# Altium footprint library pcb.PcbLib: 397 footprints (part 13 of 25)
Each footprint in its own frame and in the unit in brackets; x right, y up, seen from the top. Pads: shape width x height; smd on the part's side, far side on the other; paste and mask are expansions set on the pad; w line width, h text height; cw(c..) or ccw(c..) is an arc to the next point about the centre after c.
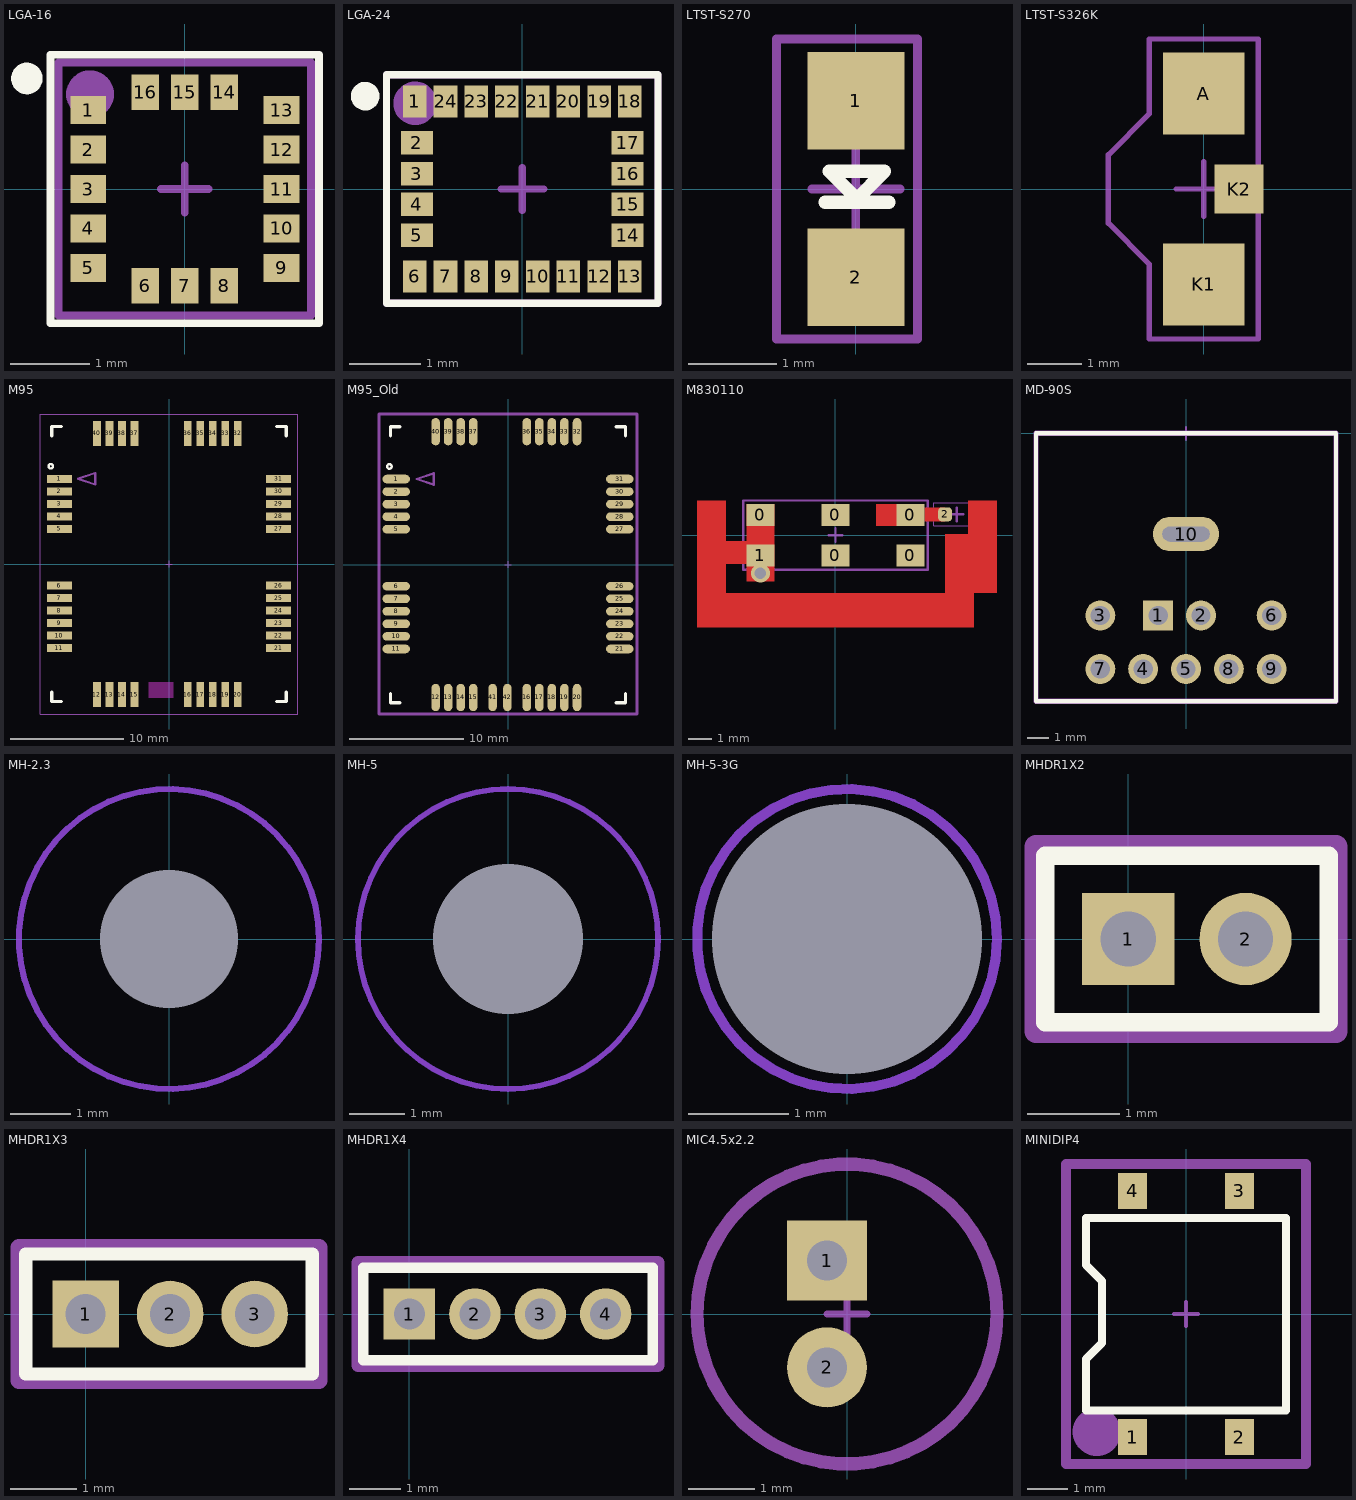
[diagram p12: the footprints below, top view; thin cyan lines are the x and y axes]

## LGA-16 [mm]
height 1
pads (16):
  rect 0.45x0.35 smd paste-0.05 mask+0.05: 1(-1.225,1) 2(-1.225,0.5) 3(-1.225,0) 4(-1.225,-0.5) 5(-1.225,-1) 9(1.225,-1) 10(1.225,-0.5) 11(1.225,0) 12(1.225,0.5) 13(1.225,1)
  rect 0.35x0.45 smd paste-0.05 mask+0.05: 6(-0.5,-1.225) 7(0,-1.225) 8(0.5,-1.225) 14(0.5,1.225) 15(0,1.225) 16(-0.5,1.225)
Top Overlay:
  circle w0.2: c-2,1.4 r0.1
  lines w0.1: -1.7,-1.7 1.7,-1.7 1.7,1.7 -1.7,1.7 -1.7,-1.7
Mechanical 15:
  circle w0.406: c-1.2,1.2 r0.1
  lines w0.1: -0.3,0 0.3,0 ; 0,-0.3 0,0.3 ; -1.6,-1.6 -1.6,1.6 1.6,1.6 1.6,-1.6 -1.6,-1.6
  text ".Designator" at -1.3,-1.3 h1.02
3D body: height 1, standoff 0, extent -1.5,-1.5 1.5,1.5

## LGA-24 [mm]
height 1
pads (24):
  rect 0.33x0.45 smd paste-0.05 mask+0.05: 1(-1.505,1.225) 6(-1.505,-1.225) 7(-1.075,-1.225) 8(-0.645,-1.225) 9(-0.215,-1.225) 10(0.215,-1.225) 11(0.645,-1.225) 12(1.075,-1.225) 13(1.505,-1.225) 18(1.505,1.225) 19(1.075,1.225) 20(0.645,1.225) 21(0.215,1.225) 22(-0.215,1.225) 23(-0.645,1.225) 24(-1.075,1.225)
  rect 0.45x0.33 smd paste-0.05 mask+0.05: 2(-1.475,0.645) 3(-1.475,0.215) 4(-1.475,-0.215) 5(-1.475,-0.645) 14(1.475,-0.645) 15(1.475,-0.215) 16(1.475,0.215) 17(1.475,0.645)
Top Overlay:
  circle w0.2: c-2.2,1.3 r0.1
  lines w0.1: -1.9,-1.6 -1.9,1.6 1.9,1.6 1.9,-1.6 -1.9,-1.6
Mechanical 15:
  circle w0.406: c-1.5,1.2 r0.1
  lines w0.1: -0.3,0 0.3,0 ; 0,-0.3 0,0.3 ; -1.9,-1.6 1.9,-1.6 1.9,1.6 -1.9,1.6 -1.9,-1.6
  text ".Designator" at -1.6,-1.3 h1.02
3D body: height 1, standoff 0, extent -1.75,-1.5 1.75,1.5

## LTST-S270 [mm] "Chip LED, Right Angle"
height 1
pads (2):
  rect 1.1x1.1 smd: 1(0,1) 2(0,-1)
Top Overlay:
  lines w0.15: -0.35,-0.15 0.375,-0.15 ; -0.3,0.2 0,-0.1 0,-0.125 0.325,0.2 -0.3,0.2
Mechanical 15:
  lines w0.1: -0.5,0 0.5,0 ; 0,-0.5 0,0.5 ; -0.9,-1.7 0.7,-1.7 0.7,1.7 -0.9,1.7 -0.9,-1.7
  text "K" at 0.9,-1.5 h1.02
  text "A" at 0.928,0.568 h1.02
  text ".Designator" at 0.3,-1.5 h0.51
3D body: height 1, standoff 0, extent -0.81,-0.6 -0.34,0.6
3D body: height 1, standoff 0, extent -0.34,-0.825 0.34,0.825

## LTST-S326K [mm] "Chip LED, Right Angle"
height 1
pads (3):
  rect 1.5x1.5 smd: A(0,1.75) K1(0,-1.75)
  rect 0.9x0.9 smd: K2(0.65,0)
Mechanical 15:
  lines w0.1: -0.5,0 0.5,0 ; 0,-0.5 0,0.5 ; -1.75,-0.625 -1.75,0.625 -1,1.375 -1,2.75 1,2.75 1,-2.75 -1,-2.75 -1,-1.375 -1.75,-0.625
  text ".Designator" at -1.25,-0.75 h0.51
3D body: height 1, standoff 0, extent -0.5,-1.5 0.5,1.5
3D body: height 0.9, standoff 0.1, extent -1.5,-1 -0.5,1

## M95 [mm]
height 0.8
pads (40):
  rect 2.2x0.7 smd paste-10 mask+0.05: 1(-9.65,7.5) 2(-9.65,6.4) 3(-9.65,5.3) 4(-9.65,4.2) 5(-9.65,3.1) 6(-9.65,-1.9) 7(-9.65,-3) 8(-9.65,-4.1) 9(-9.65,-5.2) 10(-9.65,-6.3) 11(-9.65,-7.4) 21(9.65,-7.4) 22(9.65,-6.3) 23(9.65,-5.2) 24(9.65,-4.1) 25(9.65,-3) 26(9.65,-1.9) 27(9.65,3.1) 28(9.65,4.2) 29(9.65,5.3) 30(9.65,6.4) 31(9.65,7.5)
  rect 0.7x2.2 smd paste-10 mask+0.05: 12(-6.35,-11.5) 13(-5.25,-11.5) 14(-4.15,-11.5) 15(-3.05,-11.5) 16(1.65,-11.5) 17(2.75,-11.5) 18(3.85,-11.5) 19(4.95,-11.5) 20(6.05,-11.5) 32(6.05,11.5) 33(4.95,11.5) 34(3.85,11.5) 35(2.75,11.5) 36(1.65,11.5) 37(-3.05,11.5) 38(-4.15,11.5) 39(-5.25,11.5) 40(-6.35,11.5)
Top Layer keep-out:
  rectangle: -1.8,-11.8 0.4,-10.4
Top Overlay:
  circle w0.2: c-10.4,8.6 r0.2
  lines w0.3: -10.3,-11.3 -10.3,-12.1 -9.5,-12.1 ; -10.3,11.3 -10.3,12.1 -9.5,12.1 ; 9.5,-12.1 10.3,-12.1 10.3,-11.3 ; 9.5,12.1 10.3,12.1 10.3,11.3
Top Paste:
  region: 5.7,-11.8 5.7,-12.9 6.4,-12.9 6.4,-11.8
  region: 5.8,-10.6 5.8,-11.8 6.3,-11.8 6.3,-10.6
  region: 4.6,-11.8 4.6,-12.9 5.3,-12.9 5.3,-11.8
  region: 4.7,-10.6 4.7,-11.8 5.2,-11.8 5.2,-10.6
  region: 3.5,-11.8 3.5,-12.9 4.2,-12.9 4.2,-11.8
  region: 3.6,-10.6 3.6,-11.8 4.1,-11.8 4.1,-10.6
  region: 2.4,-11.8 2.4,-12.9 3.1,-12.9 3.1,-11.8
  region: 2.5,-10.6 2.5,-11.8 3,-11.8 3,-10.6
  region: 1.3,-11.8 1.3,-12.9 2,-12.9 2,-11.8
  region: 1.4,-10.6 1.4,-11.8 1.9,-11.8 1.9,-10.6
  region: -3.4,-11.8 -3.4,-12.9 -2.7,-12.9 -2.7,-11.8
  region: -3.3,-10.6 -3.3,-11.8 -2.8,-11.8 -2.8,-10.6
  region: -4.5,-11.8 -4.5,-12.9 -3.8,-12.9 -3.8,-11.8
  region: -4.4,-10.6 -4.4,-11.8 -3.9,-11.8 -3.9,-10.6
  region: -5.6,-11.8 -5.6,-12.9 -4.9,-12.9 -4.9,-11.8
  region: -5.5,-10.6 -5.5,-11.8 -5,-11.8 -5,-10.6
  region: -6.7,-11.8 -6.7,-12.9 -6,-12.9 -6,-11.8
  region: -6.6,-10.6 -6.6,-11.8 -6.1,-11.8 -6.1,-10.6
  region: 6.4,11.8 6.4,12.9 5.7,12.9 5.7,11.8
  region: 6.3,10.6 6.3,11.8 5.8,11.8 5.8,10.6
  region: 5.3,11.8 5.3,12.9 4.6,12.9 4.6,11.8
  region: 5.2,10.6 5.2,11.8 4.7,11.8 4.7,10.6
  region: 4.2,11.8 4.2,12.9 3.5,12.9 3.5,11.8
  region: 4.1,10.6 4.1,11.8 3.6,11.8 3.6,10.6
  region: 3.1,11.8 3.1,12.9 2.4,12.9 2.4,11.8
  region: 3,10.6 3,11.8 2.5,11.8 2.5,10.6
  region: 2,11.8 2,12.9 1.3,12.9 1.3,11.8
  region: 1.9,10.6 1.9,11.8 1.4,11.8 1.4,10.6
  region: -2.7,11.8 -2.7,12.9 -3.4,12.9 -3.4,11.8
  region: -2.8,10.6 -2.8,11.8 -3.3,11.8 -3.3,10.6
  region: -3.8,11.8 -3.8,12.9 -4.5,12.9 -4.5,11.8
  region: -3.9,10.6 -3.9,11.8 -4.4,11.8 -4.4,10.6
  region: -4.9,11.8 -4.9,12.9 -5.6,12.9 -5.6,11.8
  region: -5,10.6 -5,11.8 -5.5,11.8 -5.5,10.6
  region: -6,11.8 -6,12.9 -6.7,12.9 -6.7,11.8
  region: -6.1,10.6 -6.1,11.8 -6.6,11.8 -6.6,10.6
  region: -9.95,7.85 -11.05,7.85 -11.05,7.15 -9.95,7.15
  region: -8.75,7.75 -9.95,7.75 -9.95,7.25 -8.75,7.25
  region: -9.95,6.75 -11.05,6.75 -11.05,6.05 -9.95,6.05
  region: -8.75,6.65 -9.95,6.65 -9.95,6.15 -8.75,6.15
  region: -9.95,5.65 -11.05,5.65 -11.05,4.95 -9.95,4.95
  region: -8.75,5.55 -9.95,5.55 -9.95,5.05 -8.75,5.05
  region: -9.95,4.55 -11.05,4.55 -11.05,3.85 -9.95,3.85
  region: -8.75,4.45 -9.95,4.45 -9.95,3.95 -8.75,3.95
  region: -9.95,3.45 -11.05,3.45 -11.05,2.75 -9.95,2.75
  region: -8.75,3.35 -9.95,3.35 -9.95,2.85 -8.75,2.85
  region: -9.95,-1.55 -11.05,-1.55 -11.05,-2.25 -9.95,-2.25
  region: -8.75,-1.65 -9.95,-1.65 -9.95,-2.15 -8.75,-2.15
  region: -9.95,-2.65 -11.05,-2.65 -11.05,-3.35 -9.95,-3.35
  region: -8.75,-2.75 -9.95,-2.75 -9.95,-3.25 -8.75,-3.25
  region: -9.95,-3.75 -11.05,-3.75 -11.05,-4.45 -9.95,-4.45
  region: -8.75,-3.85 -9.95,-3.85 -9.95,-4.35 -8.75,-4.35
  region: -9.95,-4.85 -11.05,-4.85 -11.05,-5.55 -9.95,-5.55
  region: -8.75,-4.95 -9.95,-4.95 -9.95,-5.45 -8.75,-5.45
  region: -9.95,-5.95 -11.05,-5.95 -11.05,-6.65 -9.95,-6.65
  region: -8.75,-6.05 -9.95,-6.05 -9.95,-6.55 -8.75,-6.55
  region: -9.95,-7.05 -11.05,-7.05 -11.05,-7.75 -9.95,-7.75
  region: -8.75,-7.15 -9.95,-7.15 -9.95,-7.65 -8.75,-7.65
  rectangle: 9.95,7.15 11.05,7.85
  rectangle: 8.75,7.25 9.95,7.75
  rectangle: 9.95,6.05 11.05,6.75
  rectangle: 8.75,6.15 9.95,6.65
  rectangle: 9.95,4.95 11.05,5.65
  rectangle: 8.75,5.05 9.95,5.55
  rectangle: 9.95,3.85 11.05,4.55
  rectangle: 8.75,3.95 9.95,4.45
  rectangle: 9.95,2.75 11.05,3.45
  rectangle: 8.75,2.85 9.95,3.35
  rectangle: 9.95,-2.25 11.05,-1.55
  rectangle: 8.75,-2.15 9.95,-1.65
  rectangle: 9.95,-3.35 11.05,-2.65
  rectangle: 8.75,-3.25 9.95,-2.75
  rectangle: 9.95,-4.45 11.05,-3.75
  rectangle: 8.75,-4.35 9.95,-3.85
  rectangle: 9.95,-5.55 11.05,-4.85
  rectangle: 8.75,-5.45 9.95,-4.95
  rectangle: 9.95,-6.65 11.05,-5.95
  rectangle: 8.75,-6.55 9.95,-6.05
  rectangle: 8.75,-7.65 9.95,-7.15
  rectangle: 9.95,-7.75 11.05,-7.05
Mechanical 15:
  lines w0.1: -0.3,0 0.3,0 ; 0,-0.3 0,0.3 ; -11.35,-13.2 -11.35,13.2 11.35,13.2 11.35,-13.2 -11.35,-13.2
  lines w0.2: -8,7.5 -6.5,8 -6.5,7 -8,7.5
  text ".Designator" at -4.8,-7.9 h1.02
3D body: height 2.65, standoff 0, extent -9.95,-11.8 9.95,11.8

## M95_Old [mm]
height 0.8
pads (42):
  oval 2.4x0.75 smd paste+0.01 mask+0.07: 1(-9.8,7.5) 2(-9.8,6.4) 3(-9.8,5.3) 4(-9.8,4.2) 5(-9.8,3.1) 6(-9.8,-1.9) 7(-9.8,-3) 8(-9.8,-4.1) 9(-9.8,-5.2) 10(-9.8,-6.3) 11(-9.8,-7.4) 21(9.8,-7.4) 22(9.8,-6.3) 23(9.8,-5.2) 24(9.8,-4.1) 25(9.8,-3) 26(9.8,-1.9) 27(9.8,3.1) 28(9.8,4.2) 29(9.8,5.3) 30(9.8,6.4) 31(9.8,7.5)
  oval 0.75x2.4 smd paste+0.01 mask+0.07: 12(-6.35,-11.65) 13(-5.25,-11.65) 14(-4.15,-11.65) 15(-3.05,-11.65) 16(1.65,-11.65) 17(2.75,-11.65) 18(3.85,-11.65) 19(4.95,-11.65) 20(6.05,-11.65) 32(6.05,11.65) 33(4.95,11.65) 34(3.85,11.65) 35(2.75,11.65) 36(1.65,11.65) 37(-3.05,11.65) 38(-4.15,11.65) 39(-5.25,11.65) 40(-6.35,11.65) 41(-1.35,-11.65) 42(-0.05,-11.65)
Top Overlay:
  circle w0.2: c-10.4,8.6 r0.2
  lines w0.3: -10.3,-11.3 -10.3,-12.1 -9.5,-12.1 ; -10.3,11.3 -10.3,12.1 -9.5,12.1 ; 9.5,-12.1 10.3,-12.1 10.3,-11.3 ; 9.5,12.1 10.3,12.1 10.3,11.3
Mechanical 15:
  lines w0.1: -0.3,0 0.3,0 ; 0,-0.3 0,0.3
  lines w0.2: -8,7.5 -6.5,8 -6.5,7 -8,7.5
  lines w0.254: -11.3,-13.1 -11.3,13.2 11.3,13.2 11.3,-13.1 -11.3,-13.1
  text ".Designator" at -4.8,-7.9 h1.02
3D body: height 2.65, standoff 0, extent -10,-11.8 10,11.8

## M830110 [mm] "GPS Antenna"
height 0.4
pads (7):
  rect 1.2x0.95 smd paste+0 mask+0: 0(-3.25,0.875) 0(0,-0.875) 0(0,0.875) 0(3.25,-0.875) 0(3.25,0.875) 1(-3.25,-0.875)
  rrect50% 0.6x0.6 smd: 2(4.75,0.9)
via -3.25,-1.65 diameter 0.813 hole 0.5
Top Layer:
  rectangle: -6,-2.775 -4.75,1.5
  rectangle: -3.85,-2 -2.65,1.35
  rectangle: -6,-4 6,-2.5
  rectangle: -4.75,-1.25 -3.85,-0.25
  rectangle: 1.75,0.4 3.25,1.35
  rectangle: 3.85,0.6 4.75,1.2
  rectangle: 4.75,-2.5 7,0.05
  rectangle: 5.75,0.05 7,1.5
Mechanical 15:
  circle w0.1: c-3.462,-1 r0.112
  circle w0.1: c-3.112,-1 r0.112
  circle w0.1: c-3.462,-0.65 r0.112
  circle w0.1: c-3.112,-0.65 r0.112
  lines w0.05: 4.25,0.4 4.25,1.4 6.25,1.4 6.25,0.4 4.25,0.4
  lines w0.1: -0.3,0 0.3,0 ; 0,-0.3 0,0.3 ; 4.95,0.9 5.55,0.9 ; 5.25,0.6 5.25,1.2 ; -4,-1.5 4,-1.5 4,1.5 -4,1.5 -4,-1.5
  text ".Designator" at -2.55,-1.05 h0.51
  text "tuning" at 4.55,1.5 h0.3
3D body: height 0.4, standoff 0, extent -4,-1.5 4,1.5

## MD-90S [mm]
height 12.9
pads (10):
  rect 1.4x1.4 hole 0.9: 1(-1.3,-8.5)
  round 1.4 hole 0.9: 2(0.7,-8.5) 3(-4,-8.5) 4(-2,-11) 5(0,-11) 6(4,-8.5) 7(-4,-11) 8(2,-11) 9(4,-11)
  oval 3.1x1.6 hole 0.7 slot 2.2 at 0 deg: 10(0,-4.7)
Top Overlay:
  lines w0.2: -7,-12.5 7,-12.5 7,0 -7,0 -7,-12.5
Mechanical 15:
  lines w0.1: -0.3,0 0.3,0 ; 0,-0.3 0,0.3
  lines w0.254: -7,-12.5 -7,0 7,0 7,-12.5 -7,-12.5
  text ".Designator" at -5.6,-2 h1.02
  text "pcb_edge" at 4.2,1.4 h1.02
3D body "MD-90S.stp": height 12.9, standoff -3.5, extent -7,-12.5 7,0

## MH-2.3 [mm]
height 1.7
pads (1):
  round 0 hole 2.3 unplated paste-25.4 mask+1.15: 0(0,0)
Top Layer keep-out:
  circle w0.1: c0,0 r2.5
Bottom Layer keep-out:
  circle w0.1: c0,0 r2.5

## MH-5 [mm]
pads (1):
  round 0 hole 2.7 unplated paste-25.4 mask-254: 0(0,0)
Top Layer keep-out:
  circle w0.1: c0,0 r2.7
Bottom Layer keep-out:
  circle w0.1: c0,0 r2.7
3D body: height 12, standoff -3, extent -2.49,-2.5 2.49,2.49

## MH-5-3G [mm]
pads (1):
  round 0 hole 2.7 unplated paste-25.4 mask-254: 0(0,0)
Top Layer keep-out:
  circle w0.1: c0,0 r1.5
Bottom Layer keep-out:
  circle w0.1: c0,0 r1.5
3D body: height 12, standoff -3, extent -2.49,-2.5 2.49,2.49

## MHDR1X2 [mm] "Connector; Header; 2 Position"
height 2.38
pads (2):
  rect 1x1 hole 0.6: 1(0,0)
  round 1 hole 0.6: 2(1.27,0)
Top Overlay:
  lines w0.2: -0.9,-0.9 2.17,-0.9 2.17,0.9 -0.9,0.9 -0.9,-0.9
Mechanical 15:
  lines w0.254: -1,-1 -1,1 2.25,1 2.25,-1 -1,-1
  text ".Designator" at -0.785,-0.711 h0.51

## MHDR1X3 [mm] "Connector; Header; 3 Position"
height 2.38
pads (3):
  rect 1x1 hole 0.6: 1(0,0)
  round 1 hole 0.6: 2(1.27,0) 3(2.54,0)
Top Overlay:
  lines w0.2: -0.9,-0.9 -0.9,0.9 3.404,0.9 3.404,-0.9 -0.9,-0.9
Mechanical 15:
  lines w0.254: -1,-1 3.505,-1 3.505,1 -1,1 -1,-1
  text ".Designator" at -0.785,-0.711 h0.51

## MHDR1X4 [mm] "Connector; Header; 4 Position"
height 2.38
pads (4):
  rect 1x1 hole 0.6: 1(0,0)
  round 1 hole 0.6: 2(1.27,0) 3(2.54,0) 4(3.81,0)
Top Overlay:
  lines w0.2: -0.9,-0.9 -0.9,0.9 4.724,0.9 4.724,-0.9 -0.9,-0.9
Mechanical 15:
  lines w0.254: -1,-1 4.826,-1 4.826,1 -1,1 -1,-1
  text ".Designator" at -0.785,-0.711 h0.51

## MIC4.5x2.2 [mm]
height 2.2
pads (2):
  rect 1.2x1.2 hole 0.6: 1(-0.3,0.8)
  round 1.2 hole 0.6: 2(-0.3,-0.8)
Mechanical 15:
  circle w0.2: c0,0 r2.25
  lines w0.1: -0.3,0 0.3,0 ; 0,-0.3 0,0.3
  text ".Designator" at -2.75,-1.7 h1.02
3D body: height 2.2, standoff 0, extent -2.25,-2.25 2.241,2.232

## MINIDIP4 [mm]
height 2.7
pads (4):
  rect 0.72x0.912 smd: 1(-1.335,-3.075) 2(1.335,-3.075) 3(1.335,3.075) 4(-1.335,3.075)
Top Overlay:
  lines w0.2: -2.5,-2.413 -2.5,-1.125 -2.1,-0.725 -2.1,0.825 -2.5,1.225 -2.5,2.4 2.5,2.4 2.5,-2.413 -2.5,-2.413
Mechanical 15:
  circle w1: c-2.234,-2.946 r0.1
  lines w0.1: -0.3,0 0.3,0 ; 0,-0.3 0,0.3
  lines w0.254: -3,-3.75 -3,3.75 3,3.75 3,-3.75 -3,-3.75
  text ".Designator" at -2.438,-1.575 h1.02
3D body: height 2.5, standoff 0, extent -2.7,-2.6 2.7,2.6